# Altium footprint library MyLibrarySum.PcbLib: 208 footprints (part 1 of 13)
Each footprint in its own frame and in the unit in brackets; x right, y up, seen from the top. Pads: shape width x height; smd on the part's side, far side on the other; paste and mask are expansions set on the pad; w line width, h text height; cw(c..) or ccw(c..) is an arc to the next point about the centre after c.
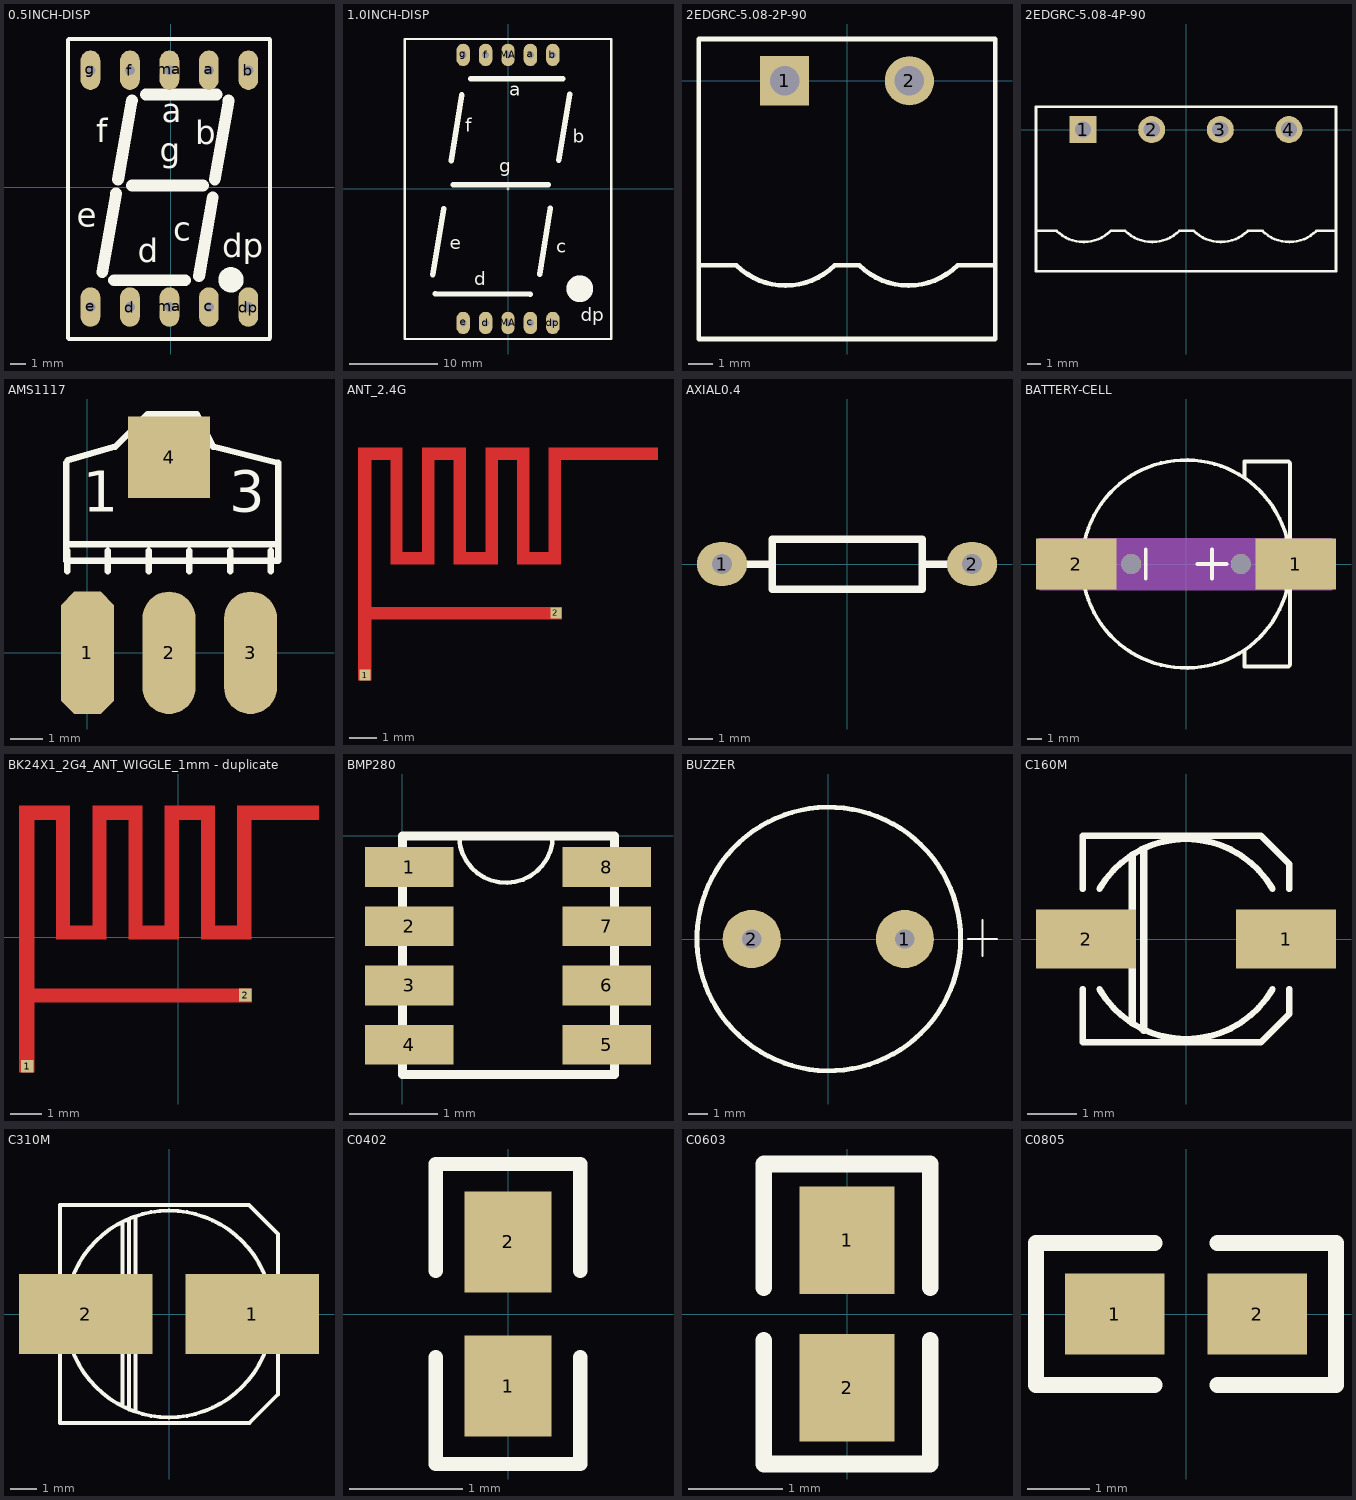
[diagram p0: the footprints below, top view; thin cyan lines are the x and y axes]

## 0.5INCH-DISP [mil]
pads (10):
  oval 50x100 hole 25: a(97,297) b(197,297) c(97,-303) d(-103,-303) dp(197,-303) e(-203,-303) f(-103,297) g(-203,297) ma(-3,-303) ma(-3,297)
Top Overlay:
  circle w40: c153,-234 r12
  lines w10: -260,-382 -260,374 ; -258,-384 251,-384 ; -258,376 251,376 ; 252,-380 252,374
  lines w30: -173,-215 -138,-15 ; -143,-235 37,-235 ; -133,20 -98,220 ; -98,5 82,5 ; -63,235 117,235 ; 72,-225 107,-25 ; 112,20 147,220
  text "f" at -188,115 h60
  text "b" at 62,110 h60
  text "g" at -28,65 h60
  text "a" at -23,165 h60
  text "d" at -83,-190 h60
  text "e" at -238,-100 h60
  text "dp" at 131,-177 h60
  text "c" at 7,-135 h60
3D body: height 316.25, standoff -156.19, extent -250,-370 250,380

## 1.0INCH-DISP [mil]
pads (10):
  oval 60x100 hole 30: a(100,598) b(200,598) c(100,-598) d(-100,-598) dp(200,-598) e(-200,-598) f(-100,598) g(-200,598) MA(0,-598) MA(0,598)
Top Overlay:
  lines w2: -6,0 6,0 ; 0,-6 0,5
  lines w10: -461,-10 -461,10 ; -460.88,-669.58 -460.88,669 ; -459.88,-669.58 461,-669.58 461,669 -459.88,669
  lines w25: -335,-382 -287,-89 ; -324,-467 99,-470 ; -254,126 -206,419 ; -244,19 179,19 ; -167,492 245,492 ; 141,-380 189,-87 ; 227,129 275,422
  text "g" at -40,75 h60
  text "dp" at 325,-590 h60
  text "f" at -190,255 h60
  text "e" at -260,-270 h60
  text "d" at -150,-430 h60
  text "c" at 215,-285 h60
  text "b" at 290,205 h60
  text "a" at 5,415 h60
Top Overlay keep-out:
  circle w100: c320.57,-445 r9.43
3D body: height 414.67, standoff -156.19, extent -480,-649.29 464.88,689.29

## 2EDGRC-5.08-2P-90 [mm]
height 8.3
pads (2):
  rect 2x2 hole 1.2: 1(-2.54,0)
  round 2 hole 1.2: 2(2.54,0)
Top Overlay:
  lines w0.2: -6.03,-7.5 -4.5,-7.5 ccw(c-2.5,-5.5) -0.5,-7.5 0.5,-7.5 ccw(c2.5,-5.5) 4.5,-7.5 6.03,-7.5 ; -6.03,-10.5 -6.03,1.7 6.03,1.7 6.03,-10.5 -6.03,-10.5
3D body: height 8.65, standoff -3.45, extent -6.08,-10.4 6.08,1.6

## 2EDGRC-5.08-4P-90 [mm]
height 8.3
pads (4):
  rect 2x2 hole 1.2: 1(-7.62,0)
  round 2 hole 1.2: 2(-2.54,0) 3(2.54,0) 4(7.62,0)
Top Overlay:
  lines w0.2: -11.11,-7.5 -9.58,-7.5 ccw(c-7.58,-5.5) -5.58,-7.5 -4.5,-7.5 ccw(c-2.5,-5.5) -0.5,-7.5 0.58,-7.5 ccw(c2.58,-5.5) 4.58,-7.5 5.66,-7.5 ccw(c7.66,-5.5) 9.66,-7.5 11.11,-7.5 ; -11.11,-10.5 11.11,-10.5 11.11,1.7 -11.11,1.7 -11.11,-10.5
3D body: height 8.6, standoff -3.5, extent -11.16,-10.414 11.16,1.586

## AMS1117 [mil]
pads (4):
  oct 65x150 smd: 1(0.03,-0.06)
  oval 65x150 smd: 2(100.03,-0.06) 3(200.03,-0.06)
  rect 100x100 smd: 4(100.03,239.94)
Top Overlay:
  lines w7.87: -25.97,232.94 -25.97,132.94 ; -24.97,99.94 -24.97,124.94 ; -24.3,236.27 34.03,252.94 74.03,292.94 134.03,292.94 154.03,252.94 234.03,232.94 234.03,112.94 ; 25.03,99.94 25.03,124.94 ; 75.03,99.94 75.03,124.94 ; 125.03,99.94 125.03,124.94 ; 175.03,99.94 175.03,124.94 ; 225.03,99.94 225.03,124.94 ; -25.97,132.94 234.03,132.94 234.03,112.94 ; -25.97,132.94 -25.97,112.94 234.03,112.94
  text "3" at 174.03,172.94 h50
  text "1" at -5.97,172.94 h50
3D body: height 33.46, standoff -39.76, extent -25,-37.78 230.91,237.78

## ANT_2.4G [mm]
pads (2):
  rect 0.4x0.4 smd: 1(-11.658,91.963) 2(-4.728,94.223)
Top Layer:
  rectangle: -4.991,99.788 -1.016,100.238
  rectangle: -11.641,93.989 -4.511,94.438
  rectangle: -11.92,99.788 -10.295,100.237
  rectangle: -10.741,95.988 -10.295,100.242
  rectangle: -10.741,95.988 -9.141,96.439
  rectangle: -9.591,95.988 -9.141,100.237
  rectangle: -9.591,99.787 -7.99,100.237
  rectangle: -8.441,95.987 -7.99,100.237
  rectangle: -8.441,95.987 -6.84,96.437
  rectangle: -7.291,95.987 -6.84,100.237
  rectangle: -7.291,99.787 -5.689,100.24
  rectangle: -6.139,95.987 -5.689,100.24
  rectangle: -6.139,95.987 -4.541,96.437
  rectangle: -4.991,95.987 -4.541,100.238
  rectangle: -11.92,91.764 -11.42,100.237

## AXIAL0.4 [mil]
pads (2):
  oval 80x70 hole 32: 1(-200,0) 2(200,0)
Top Overlay:
  lines w12: -160,0 -120,0 ; 120,0 160,0 ; -120,-40 120,-40 120,40 -120,40 -120,-40
3D body: height 128.35, standoff -78.74, extent -213.62,-50 210,49.21

## BATTERY-CELL [mil] "BAT1"
pads (4):
  rect 220x140 smd: 1(300,0) 2(-300,0)
  round 55 hole 55: " "(-150,0) " "(150,0)
Top Overlay:
  circle w10: c0,0 r284.25
  lines w10: -110,-40 -110,40 ; 31,0.2 111,0.2 ; 71,-39.8 71,40.2 ; 160,-240 160,-280 280,-280 284.25,-275.75 284.25,0 284.25,275.75 280,280 160,280 160,240
Mechanical 11:
  text "2" at -300,-10 h25
  text "1" at 300,-10 h25
Mechanical 12:
  lines w1: -400,-70 -400,70 400,70 400,-70 -400,-70
Mechanical 13:
  region: -400,-70 400,-70 400,70 -400,70
3D body: height 98.43, standoff 0, extent -235,-235 237.44,237.44

## BK24X1_2G4_ANT_WIGGLE_1mm - duplicate [mm]
pads (2):
  rect 0.4x0.4 smd: 1(-4.8,-4.1) 2(2.13,-1.84)
Top Layer:
  rectangle: -5.062,-4.299 -4.562,4.174
  rectangle: -4.783,-2.074 2.347,-1.625
  rectangle: -5.062,3.725 -3.437,4.174
  rectangle: -3.883,-0.074 -3.437,4.179
  rectangle: -3.883,-0.074 -2.283,0.376
  rectangle: -2.733,-0.074 -2.283,4.174
  rectangle: -2.733,3.724 -1.132,4.174
  rectangle: -1.583,-0.076 -1.132,4.174
  rectangle: -1.583,-0.076 0.018,0.375
  rectangle: -0.433,-0.076 0.018,4.174
  rectangle: -0.433,3.724 1.169,4.177
  rectangle: 0.719,-0.076 1.169,4.177
  rectangle: 0.719,-0.076 2.317,0.375
  rectangle: 1.867,-0.076 2.317,4.175
  rectangle: 1.867,3.726 4.467,4.175

## BMP280 [mm]
pads (8):
  rect 1x0.45 smd: 1(0.076,-0.352) 2(0.076,-1.022) 3(0.076,-1.691) 4(0.076,-2.362) 5(2.311,-2.362) 6(2.311,-1.691) 7(2.311,-1.022) 8(2.311,-0.352)
Top Overlay:
  lines w0.05: 0.642,-0.031 ccw(c1.171,0) 1.702,0
  lines w0.1: 2.38,-2.7 0,-2.7 0,0 2.4,0 2.4,-2.7

## BUZZER [mil]
pads (2):
  round 120 hole 40: 1(158,0) 2(-158,0)
Top Overlay:
  circle w10: c1.11,0 r271.89
  lines w4: 288,0 313,0 ; 302,0 348,0 ; 318,-35 318,39
3D body: height 299, standoff -216.54, extent -259.5,-270 279.5,269

## C160M [mil]
pads (2):
  rect 80x47.24 smd: 1(80,0) 2(-80,0)
Top Overlay:
  lines w5: -82.68,-40 -82.68,-82.68 60,-82.68 ; -82.68,40 -82.68,82.68 60,82.68 ; -69.28,-40 ccw(c0,0) 69.28,-40 ; -69.28,40 cw(c0,0) 69.28,40 ; 35,-82.68 60,-82.68 ; 48,82.68 60,82.68 ; 51,82.68 59,82.68 ; 82.68,-40 82.68,-60 60,-82.68 ; 82.68,40 82.68,60 60,82.68
  lines w6: -43,-67 -43,67 ; -34,-73 -34,71

## C310M [mil]
pads (2):
  rect 200x120 smd paste-39.37 mask-39.37: 1(125,0) 2(-125,0)
Top Overlay:
  lines w6: -163.39,-55.35 -163.39,-163.39 110,-163.39 120.39,-163.39 163.39,-120.39 163.39,-96 ; -163.39,51.3 -163.39,163.39 115,163.39 120,163.39 163.39,120 163.39,50 ; -145.65,-53.01 ccw(c0,0) 145.65,-53.01 ; -145.65,53.01 cw(c0,0) 145.65,53.01 ; -70,-138 -70,137 ; -60,-143 -60,140 ; -50,-145 -50,144 ; 163.39,-115 163.39,-50

## C0402 [mil] "SMT电容"
height 19.68
pads (2):
  rect 30x35 smd: 1(0,-25) 2(0,25)
Top Overlay:
  lines w5: -25,-15 -25,-52 25,-52 25,-15 ; -25,15 -25,52 25,52 25,15
3D body: height 19.68, standoff 0, extent -10.83,-19.65 10.83,19.72
3D body: height 19.68, standoff 0, extent -8.86,-19.65 10.83,19.72

## C0603 [mil] "SMT电容"
height 31.5
pads (2):
  rect 40x45 smd: 1(0,31) 2(0,-31)
Top Overlay:
  lines w7: -35,-11 -35,-63 35,-63 35,-11 ; -35,11 -35,63 35,63 35,11
3D body: height 31.5, standoff 0, extent -18.07,-31.54 18.15,31.46

## C0805 [mm] "SMT电容"
height 1.3
pads (2):
  rect 1.6x1.3 smd: 1(-1.143,0) 2(1.143,0)
Top Overlay:
  lines w0.254: -0.508,-1.143 -2.413,-1.143 -2.413,1.143 -0.508,1.143 ; 0.508,-1.143 2.413,-1.143 2.413,1.143 0.508,1.143
3D body: height 1.2, standoff 0, extent -1,-0.674 1,0.676